# Altium footprint library GRIx4.PcbLib: 29 footprints (part 1 of 2)
Each footprint in its own frame and in the unit in brackets; x right, y up, seen from the top. Pads: shape width x height; smd on the part's side, far side on the other; paste and mask are expansions set on the pad; w line width, h text height; cw(c..) or ccw(c..) is an arc to the next point about the centre after c.
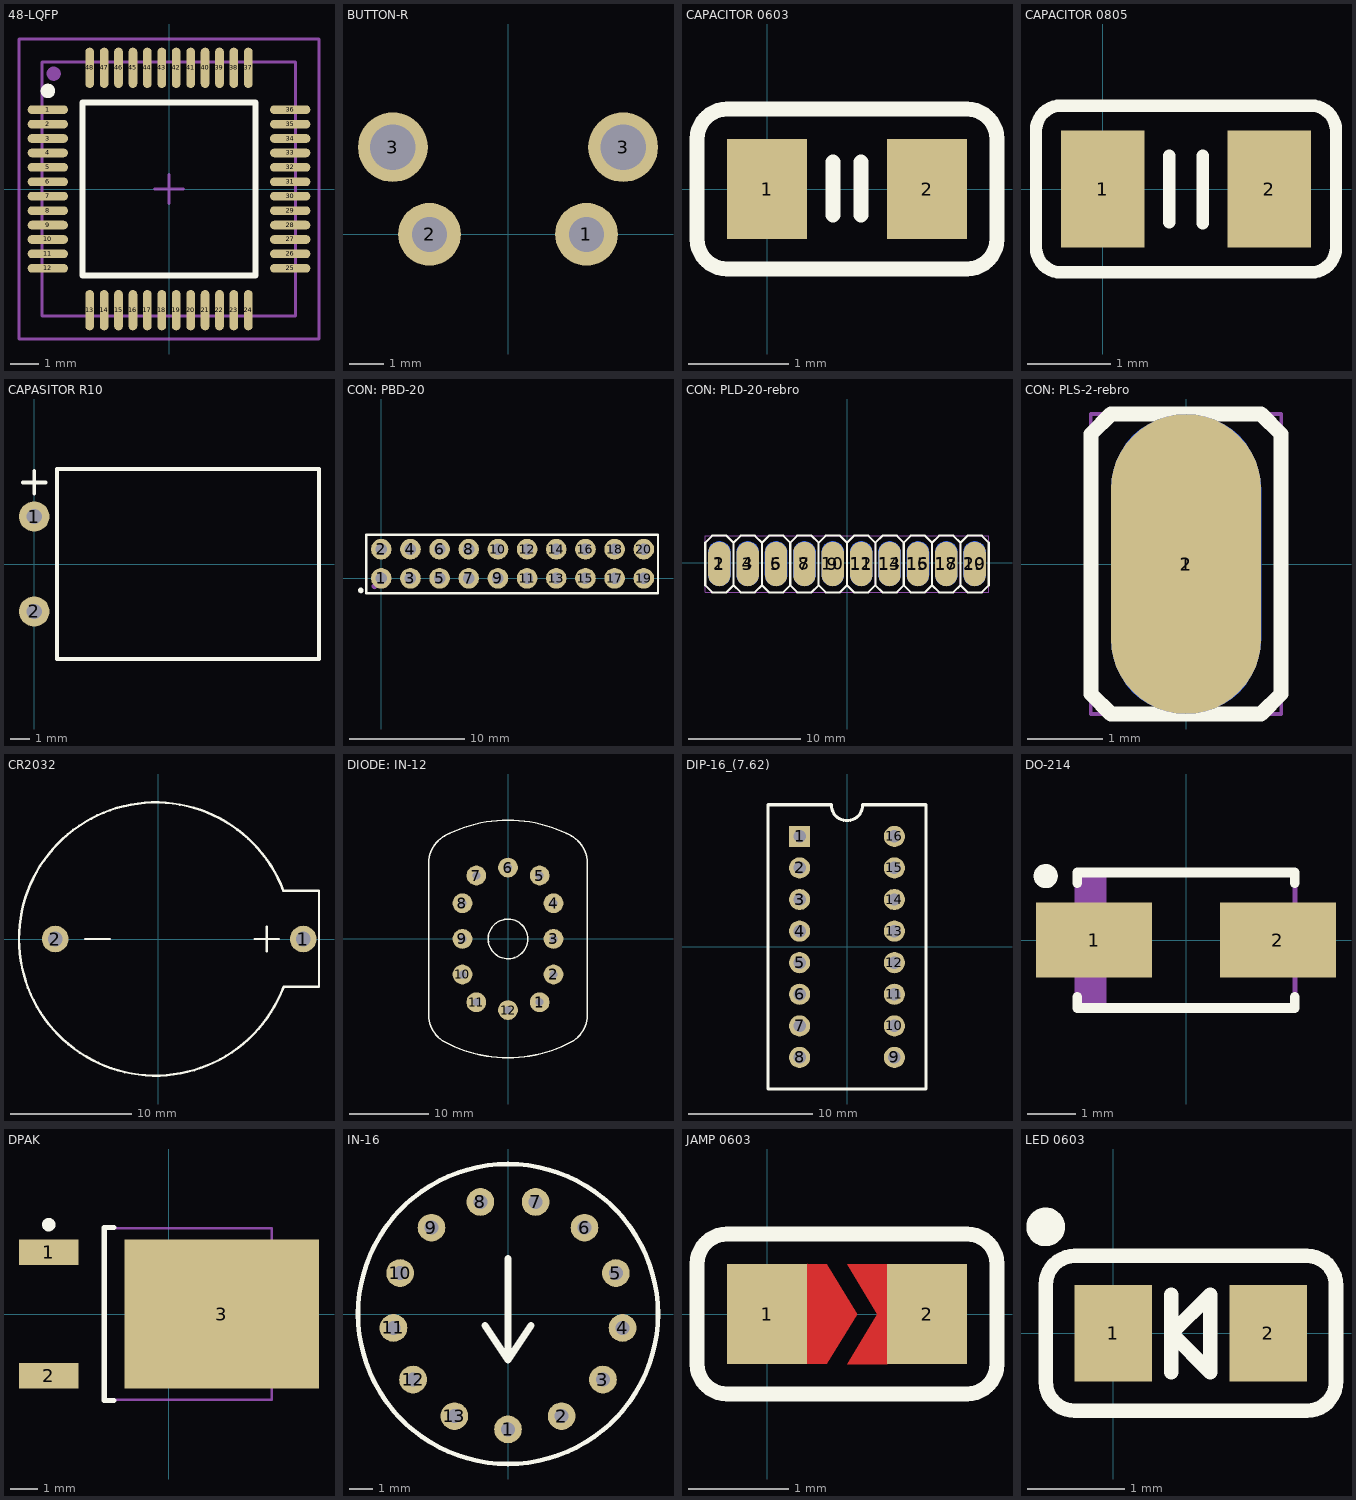
[diagram p0: the footprints below, top view; thin cyan lines are the x and y axes]

## 48-LQFP [mm] "QFP, 48-Leads, Body 7x7mm, Pitch 0.5mm, IPC Medium Density"
height 1.6
pads (49):
  oval 1.4x0.3 smd: 1(-4.2,2.75) 2(-4.2,2.25) 3(-4.2,1.75) 4(-4.2,1.25) 5(-4.2,0.75) 6(-4.2,0.25) 7(-4.2,-0.25) 8(-4.2,-0.75) 9(-4.2,-1.25) 10(-4.2,-1.75) 11(-4.2,-2.25) 12(-4.2,-2.75) 25(4.2,-2.75) 26(4.2,-2.25) 27(4.2,-1.75) 28(4.2,-1.25) 29(4.2,-0.75) 30(4.2,-0.25) 31(4.2,0.25) 32(4.2,0.75) 33(4.2,1.25) 34(4.2,1.75) 35(4.2,2.25) 36(4.2,2.75)
  oval 0.3x1.4 smd: 13(-2.75,-4.2) 14(-2.25,-4.2) 15(-1.75,-4.2) 16(-1.25,-4.2) 17(-0.75,-4.2) 18(-0.25,-4.2) 19(0.25,-4.2) 20(0.75,-4.2) 21(1.25,-4.2) 22(1.75,-4.2) 23(2.25,-4.2) 24(2.75,-4.2) 37(2.75,4.2) 38(2.25,4.2) 39(1.75,4.2) 40(1.25,4.2) 41(0.75,4.2) 42(0.25,4.2) 43(-0.25,4.2) 44(-0.75,4.2) 45(-1.25,4.2) 46(-1.75,4.2) 47(-2.25,4.2) 48(-2.75,4.2)
  round 0.5 on Mech1: ""(-4,4)
Top Overlay:
  circle w0.25: c-4.2,3.4 r0.125
  lines w0.2: -3,-3 -3,3 3,3 3,-3 -3,-3
Mechanical 1:
  lines w0.1: -4.4,-4.4 -4.4,4.4 4.386,4.4 4.386,-4.4 -4.4,-4.4
Mechanical 15:
  lines w0.1: -0.5,0 0.5,0 ; 0,-0.5 0,0.5 ; -5.2,-5.2 -5.2,5.2 5.2,5.2 5.2,-5.2 -5.2,-5.2
3D body: height 1.55, standoff -0.02, extent -4.386,-4.386 4.386,4.386

## BUTTON-R [mm]
pads (4):
  round 1.8 hole 1: 1(2.25,0) 2(-2.25,0)
  round 2 hole 1.3: 3(-3.3,2.5) 3(3.3,2.5)
3D body: height 7.05, standoff -2.98, extent -4.033,-8.3 4.033,4

## CAPACITOR 0603 [mm]
pads (2):
  rect 0.8x1 smd: 1(0,0) 2(1.6,0)
Top Overlay:
  lines w0.15: 0.66,-0.26 0.66,0.27 ; 0.94,-0.26 0.94,0.27 ; -0.7,-0.5 ccw(c-0.4,-0.5) -0.4,-0.8 2,-0.8 ccw(c2,-0.5) 2.3,-0.5 2.3,0.5 ccw(c2,0.5) 2,0.8 -0.4,0.8 ccw(c-0.4,0.5) -0.7,0.5 -0.7,-0.5
3D body: height 0.8, standoff 0, extent 0.02,-0.37 1.62,0.41
3D body: height 0.81, standoff 0, extent -0.01,-0.38 0.32,0.42
3D body: height 0.81, standoff 0, extent 1.32,-0.38 1.64,0.42

## CAPACITOR 0805 [mm]
pads (2):
  rect 1x1.4 smd: 1(0,0) 2(2,0)
Top Overlay:
  lines w0.15: 0.8,-0.4 0.8,0.4 ; 1.2,-0.41 1.2,0.4 ; -0.8,-0.7 ccw(c-0.5,-0.7) -0.5,-1 2.5,-1 ccw(c2.5,-0.7) 2.8,-0.7 2.8,0.7 ccw(c2.5,0.7) 2.5,1 -0.5,1 ccw(c-0.5,0.7) -0.8,0.7 -0.8,-0.7
3D body: height 1.26, standoff 0, extent 1.7,-0.6 2.01,0.6
3D body: height 1.26, standoff 0, extent 0.01,-0.605 0.36,0.595
3D body: height 1.25, standoff 0, extent 0.33,-0.58 1.72,0.58

## CAPASITOR R10 [mm]
pads (2):
  round 1.6 hole 0.8: 1(0,2.5) 2(0,-2.5)
Top Overlay:
  lines w0.2: -0.6,4.3 0.6,4.3 ; 0,3.7 0,4.9 ; 1.2,-5 15,-5 15,5 1.2,5 1.2,-5
3D body: height 10, standoff 0, extent 1,-4.998 15,4.998
3D body: height 5.3, standoff 4.7, extent -0.3,-2.8 1.1,-2.2
3D body: height 5, standoff -1.5, extent -0.297,-2.799 0.3,-2.2
3D body: height 5, standoff -1.5, extent -0.297,2.201 0.3,2.8
3D body: height 5.3, standoff 4.7, extent -0.3,2.2 1.1,2.8

## CON: PBD-20 [mm]
pads (22):
  round 1.8 hole 1: 1(0,0) 2(0,2.54) 3(2.54,0) 4(2.54,2.54) 5(5.08,0) 6(5.08,2.54) 7(7.62,0) 8(7.62,2.54) 9(10.16,0) 10(10.16,2.54) 11(12.7,0) 12(12.7,2.54) 13(15.24,0) 14(15.24,2.54) 15(17.78,0) 16(17.78,2.54) 17(20.32,0) 18(20.32,2.54) 19(22.86,0) 20(22.86,2.54)
  round 0.5 on Top Overlay: ""(-1.775,-1.05)
  round 0.5 on Mech1: ""(-0.6,-0.7)
Top Overlay:
  lines w0.2: -1.3,-1.3 -1.3,3.8 24.1,3.8 24.1,-1.3 -1.3,-1.3
Mechanical 1:
  lines w0.1: -1.3,-1.3 24.1,-1.3 24.1,3.78 -1.3,3.78 -1.3,-1.3
Mechanical 15:
  lines w0.1: -1.3,-1.3 24.1,-1.3 24.1,3.8 -1.3,3.8 -1.3,-1.3
3D body: height 8.4, standoff -2.7, extent -1.3,-1.3 24.1,3.78

## CON: PLD-20-rebro [mm]
height 10
pads (20):
  oval 2x4 smd: 1(-11.43,-0.127) 3(-8.89,-0.127) 5(-6.35,-0.127) 7(-3.81,-0.127) 9(-1.27,-0.127) 11(1.27,-0.127) 13(3.81,-0.127) 15(6.35,-0.127) 17(8.89,-0.127) 19(11.43,-0.127)
  oval 2x4 smd far side: 2(-11.43,-0.087) 4(-8.89,-0.087) 6(-6.35,-0.087) 8(-3.81,-0.087) 10(-1.27,-0.087) 12(1.27,-0.087) 14(3.81,-0.087) 16(6.35,-0.087) 18(8.89,-0.087) 20(11.43,-0.087)
Top Overlay:
  lines w0.2: -12.065,2.413 -10.795,2.413 ; -12.065,2.413 -12.7,1.778 -12.7,-2.032 -12.065,-2.667 -10.795,-2.667 -10.16,-2.032 ; -12.065,2.413 -10.795,2.413 ; -10.795,2.413 -10.16,1.778 ; -10.16,-2.032 -9.525,-2.667 -8.255,-2.667 -7.62,-2.032 ; -10.16,-2.032 -10.16,1.778 ; -10.16,1.778 -9.525,2.413 ; -9.525,2.413 -8.255,2.413 ; -9.525,2.413 -8.255,2.413 ; -8.255,2.413 -7.62,1.778 ; -7.62,-2.032 -7.62,1.778 ; -7.62,-2.032 -6.985,-2.667 -5.715,-2.667 -5.08,-2.032 ; -7.62,1.778 -6.985,2.413 ; -6.985,2.413 -5.715,2.413 ; -6.985,2.413 -5.715,2.413 ; -5.715,2.413 -5.08,1.778 ; -5.08,-2.032 -5.08,1.778 ; -5.08,-2.032 -4.445,-2.667 -3.175,-2.667 -2.54,-2.032 ; -5.08,1.778 -4.445,2.413 ; -4.445,2.413 -3.175,2.413 ; -4.445,2.413 -3.175,2.413 ; -3.175,2.413 -2.54,1.778 ; -2.54,-2.032 -2.54,1.778 ; -2.54,-2.032 -1.905,-2.667 -0.635,-2.667 0,-2.032 ; -2.54,1.778 -1.905,2.413 ; -1.905,2.413 -0.635,2.413 ; -1.905,2.413 -0.635,2.413 ; -0.635,2.413 0,1.778 ; 0,-2.032 0,1.778 ; 0,-2.032 0.635,-2.667 1.905,-2.667 2.54,-2.032 ; 0,1.778 0.635,2.413 ; 0.635,2.413 1.905,2.413 ; 0.635,2.413 1.905,2.413 ; 1.905,2.413 2.54,1.778 ; 2.54,-2.032 2.54,1.778 ; 2.54,-2.032 3.175,-2.667 4.445,-2.667 5.08,-2.032 ; 2.54,1.778 3.175,2.413 ; 3.175,2.413 4.445,2.413 ; 3.175,2.413 4.445,2.413 ; 4.445,2.413 5.08,1.778 ; 5.08,-2.032 5.715,-2.667 6.985,-2.667 7.62,-2.032 ; 5.08,-2.032 5.08,1.778 ; 5.08,1.778 5.715,2.413 ; 5.715,2.413 6.985,2.413 ; 5.715,2.413 6.985,2.413 ; 6.985,2.413 7.62,1.778 ; 7.62,-2.032 7.62,1.778 ; 7.62,-2.032 8.255,-2.667 9.525,-2.667 10.16,-2.032 ; 7.62,1.778 8.255,2.413 ; 8.255,2.413 9.525,2.413 ; 8.255,2.413 9.525,2.413 ; 9.525,2.413 10.16,1.778 ; 10.16,-2.032 10.16,1.778 ; 10.16,-2.032 10.795,-2.667 12.065,-2.667 12.7,-2.032 12.7,1.778 12.065,2.413 ; 10.16,1.778 10.795,2.413 ; 10.795,2.413 12.065,2.413 ; 10.795,2.413 12.065,2.413
Mechanical 1:
  lines w0.1: -10.16,-2.032 -9.525,-2.667 -8.255,-2.667 -7.62,-2.032 ; -10.16,-2.032 -10.795,-2.667 -12.065,-2.667 -12.7,-2.032 -12.7,1.778 -12.065,2.413 -10.795,2.413 -10.16,1.778 ; -10.16,-2.032 -10.16,1.778 ; -10.16,1.778 -9.525,2.413 -8.255,2.413 -7.62,1.778 ; -7.62,-2.032 -6.985,-2.667 -5.715,-2.667 -5.08,-2.032 ; -7.62,-2.032 -7.62,1.778 ; -7.62,1.778 -6.985,2.413 -5.715,2.413 -5.08,1.778 ; -5.08,-2.032 -4.445,-2.667 -3.175,-2.667 -2.54,-2.032 ; -5.08,-2.032 -5.08,1.778 ; -5.08,1.778 -4.445,2.413 -3.175,2.413 -2.54,1.778 ; -2.54,-2.032 -1.905,-2.667 -0.635,-2.667 0,-2.032 ; -2.54,-2.032 -2.54,1.778 ; -2.54,1.778 -1.905,2.413 -0.635,2.413 0,1.778 ; 0,-2.032 0.635,-2.667 1.905,-2.667 2.54,-2.032 ; 0,-2.032 0,1.778 ; 0,1.778 0.635,2.413 1.905,2.413 2.54,1.778 ; 2.54,-2.032 3.175,-2.667 4.445,-2.667 5.08,-2.032 ; 2.54,-2.032 2.54,1.778 ; 2.54,1.778 3.175,2.413 4.445,2.413 5.08,1.778 ; 5.08,-2.032 5.715,-2.667 6.985,-2.667 7.62,-2.032 ; 5.08,-2.032 5.08,1.778 ; 5.08,1.778 5.715,2.413 6.985,2.413 7.62,1.778 ; 7.62,-2.032 8.255,-2.667 9.525,-2.667 10.16,-2.032 ; 7.62,-2.032 7.62,1.778 ; 7.62,1.778 8.255,2.413 9.525,2.413 10.16,1.778 ; 10.16,-2.032 10.795,-2.667 12.065,-2.667 12.7,-2.032 12.7,1.778 12.065,2.413 10.795,2.413 10.16,1.778 ; 10.16,-2.032 10.16,1.778
Mechanical 15:
  lines w0.05: -12.7,-2.667 -12.7,2.413 12.7,2.413 12.7,-2.667 -12.7,-2.667
3D body: height 1.77, standoff -3.31, extent -12.7,-10.723 12.7,0.817

## CON: PLS-2-rebro [mm]
height 10
pads (2):
  oval 2x4 smd: 1(0,0)
  oval 2x4 smd far side: 2(0,0)
Top Overlay:
  lines w0.2: -1.27,-1.73 -1,-2 1,-2 1.27,-1.73 1.27,1.73 1,2 -1,2 -1.27,1.73 -1.27,-1.73
Mechanical 1:
  lines w0.1: -1.27,-1.73 -1,-2 1,-2 1.27,-1.73 1.27,1.73 1,2 -1,2 -1.27,1.73 -1.27,-1.73
Mechanical 15:
  lines w0.05: -1.27,-2 -1.27,2 1.27,2 1.27,-2 -1.27,-2
  lines w0.1: -1.27,-0.5 -1.27,0.5
3D body: height 2.32, standoff -2.76, extent -1.285,-10.54 1.255,1

## CR2032 [mm]
pads (2):
  round 2.2 hole 1.2: 1(12,0) 2(-8.5,0)
Top Overlay:
  lines w0.2: -6,0.002 -4,0.002 ; 8,0 10,0 ; 9,-1 9,1 ; 10.373,-3.952 13.305,-3.952 13.305,0.002 13.305,4.002 ; 10.381,-3.944 cw(c-0.2,0) 10.36,4 13.3,4
3D body: height 8, standoff -2.95, extent -11.3,-11.3 12.2,11.3

## DIODE: IN-12 [mm] "Vacuum Indicator"
height 28
pads (12):
  round 2.5 hole 1: 1(4.001,-8.002) 2(5.751,-4.501) 3(5.751,0) 4(5.751,4.501) 5(4.001,8.002) 6(0,9.002) 7(-4.001,8.002) 8(-5.751,4.501) 9(-5.751,0) 10(-5.751,-4.501) 11(-4.001,-8.002) 12(0,-9.002)
Top Overlay:
  circle w0.2: c0,-0.011 r2.501
  lines w0.2: -10.002,-10.019 ccw(c-6.143,-9.616) -8.002,-13.022 ccw(c0,1.954) 8.002,-13.022 ccw(c6.143,-9.616) 10.002,-10.019 10.002,9.997 ccw(c6.143,9.594) 8.002,13 ccw(c0,-1.982) -8.002,13 ccw(c-6.143,9.594) -10.002,9.997 -10.002,-10.019

## DIP-16_(7.62) [mm]
pads (16):
  rect 1.7x1.7 hole 1: 1(-3.81,8.89)
  round 1.7 hole 1: 2(-3.81,6.35) 3(-3.81,3.81) 4(-3.81,1.27) 5(-3.81,-1.27) 6(-3.81,-3.81) 7(-3.81,-6.35) 8(-3.81,-8.89) 9(3.81,-8.89) 10(3.81,-6.35) 11(3.81,-3.81) 12(3.81,-1.27) 13(3.81,1.27) 14(3.81,3.81) 15(3.81,6.35) 16(3.81,8.89)
Top Overlay:
  lines w0.254: -6.35,-11.43 6.35,-11.43 6.35,11.43 1.27,11.43 cw(c0,11.43) -1.27,11.43 -6.35,11.43 -6.35,-11.43

## DO-214 [mm]
pads (2):
  rect 2.4x1.55 smd: 1(-1.9,0) 2(1.9,0)
Top Overlay:
  circle w0.25: c-2.9,1.325 r0.125
  lines w0.2: -2.25,-1.175 -2.25,-1.4 2.25,-1.4 2.25,-1.175 ; -2.25,1.175 -2.25,1.4 2.25,1.4 2.25,1.175
Mechanical 13:
  rectangle: -2.25,-1.395 -1.645,1.395
  lines w0.1: -2.25,-1.395 -2.25,1.395 2.25,1.395 2.25,-1.395 -2.25,-1.395
3D body: height 2, standoff 0, extent -2.25,-1.395 2.25,1.395

## DPAK [mm]
pads (3):
  rect 2.2x0.95 smd: 1(-4.45,2.28) 2(-4.45,-2.28)
  rect 7.2x5.5 smd: 3(1.95,0)
Top Overlay:
  circle w0.25: c-4.45,3.305 r0.125
  lines w0.2: -2.05,-3.2 -2.4,-3.2 -2.4,3.2 -2.05,3.2
Mechanical 13:
  lines w0.1: -2.4,-3.175 3.8,-3.175 3.8,3.175 -2.4,3.175 -2.4,-3.175
3D body: height 2.38, standoff 0.01, extent -2.4,-3.175 3.8,3.175

## IN-16 [mm]
pads (13):
  round 1.2 hole 0.6: 1(0,-5) 2(2.324,-4.427) 3(4.115,-2.84) 4(4.964,-0.603) 5(4.675,1.773) 6(3.316,3.743) 7(1.197,4.855) 8(-1.197,4.855) 9(-3.316,3.743) 10(-4.675,1.773) 11(-4.964,-0.603) 12(-4.115,-2.84) 13(-2.324,-4.427)
Top Overlay:
  circle w0.2: c0,0 r6.5
  lines w0.3: -1,-0.5 0,-2 ; 0,2.4 0,-2 ; 1,-0.5 0,-2
3D body: height 46.5, standoff -2, extent -6.5,-6.5 6.5,6.5

## JAMP 0603 [mm]
pads (2):
  rect 0.8x1 smd: 1(0,0) 2(1.6,0)
Top Layer:
  region: 0.8,0.5 1.1,0 0.8,-0.5 1.2,-0.5 1.2,0.5
  region: 0.6,0.5 0.9,0 0.6,-0.5 0.4,-0.5 0.4,0.5
Top Overlay:
  lines w0.15: -0.7,-0.5 ccw(c-0.4,-0.5) -0.4,-0.8 2,-0.8 ccw(c2,-0.5) 2.3,-0.5 2.3,0.5 ccw(c2,0.5) 2,0.8 -0.4,0.8 ccw(c-0.4,0.5) -0.7,0.5 -0.7,-0.5
Top Solder:
  region: 0.5,-0.6 1.1,-0.6 1.1,0.6 0.5,0.6

## LED 0603 [mm]
pads (2):
  rect 0.8x1 smd: 1(0,0) 2(1.6,0)
Top Overlay:
  circle w0.2: c-0.7,1.1 r0.1
  lines w0.15: 0.6,-0.4 0.6,0.4 ; -0.7,-0.5 ccw(c-0.4,-0.5) -0.4,-0.8 2,-0.8 ccw(c2,-0.5) 2.3,-0.5 2.3,0.5 ccw(c2,0.5) 2,0.8 -0.4,0.8 ccw(c-0.4,0.5) -0.7,0.5 -0.7,-0.5 ; 0.6,0 1,-0.4 1,0.4 0.6,0
3D body: height 0.5, standoff 0, extent 0.205,-0.475 1.4,0.475
3D body: height 0.1, standoff 0, extent -0.1,-0.5 1.7,0.5